# Altium schematic symbol library 13-Logic 数字 IC.SchLib: 324 symbols (part 2 of 30) (continued)
## 5AGXMB1G4F40C4N_basicORCAD (continued)
part I pins: AA5 VCCT_GXBR1 (power), AA7 VCCA_GXBR1 (power), AA9 VCCA_FPLL (power), AA10 VCC (power), AA12 VCC (power), AA14 VCC (power), AA16 VCC (power), AA18 VCC (power), AA20 VCC (power), AA21 VCCP (power), AA22 VCC (power), AA24 VCC (power), AA25 VCCP (power), AA26 VCC (power), AA27 VCCPD3 (power), AA28 VCCPD3 (power), AA29 VCCPD3 (power), AA34 VCCT_GXBL1 (power), AB5 VCCR_GXBR (power), AB6 VCCR_GXBR (power), AB11 VCC (power), AB12 VCCPD4BCD (power), AB13 VCCPD4BCD (power), AB14 VCC_AUX (power), AB15 VCCP (power), AB16 VCCPD4BCD (power), AB17 VCC (power), AB18 VCCPD4BCD (power), AB19 VCCPD4BCD (power), AB20 VCCD_FPLL (power), AB21 VCCA_FPLL (power), AB22 VCCPD3 (power), AB23 VCCPD3 (power), AB24 VCCPD3 (power), AB26 VCC_AUX (power), AB30 VCCPD3 (power), AB33 VCCA_GXBL1 (power), AB35 VCCT_GXBL1 (power), AC5 VCCL_GXBR0 (power), AC6 VCCL_GXBR0 (power), AC7 VCCH_GXBR0 (power), AC9 VCCA_FPLL (power), AC10 VCCPD4A (power), AC30 VCCA_FPLL (power), AC34 VCCR_GXBL (power), AC35 VCCR_GXBL (power), AD6 VCCT_GXBR0 (power), AD31 VCCD_FPLL (power), AD33 VCCH_GXBL0 (power), AD34 VCCL_GXBL0 (power), AD35 VCCL_GXBL0 (power), AE5 VCCT_GXBR0 (power), AE7 VCCA_GXBR0 (power), AE9 VCCD_FPLL (power), AE10 VCCPD4A (power), AE34 VCCT_GXBL0 (power), AF5 VCCR_GXBR (power), AF6 VCCR_GXBR (power), AF33 VCCA_GXBL0 (power), AF35 VCCT_GXBL0 (power), AG10 VCCIO4A (power), AG29 VCCPGM (power), AG34 VCCR_GXBL (power), AG35 VCCR_GXBL (power), AH29 VCCIO3A (power), AJ5 VCCIO4A (power), AJ15 VCCIO4C (power), AJ19 VCCIO4D (power), AJ22 VCCIO3D (power), AJ24 VCCIO3C (power), AJ30 VCCIO3A (power), AK13 VCCIO4B (power), AK18 VCCIO4D (power), AK28 VCCIO3B (power), AK35 VCCIO3A (power), AL5 VCCIO4A (power), AL21 VCCIO3D (power), AL25 VCCIO3C (power), AL27 VCCIO3B (power), AM12 VCCIO4B (power), AM15 VCCIO4C (power), AM19 VCCIO4D (power), AM22 VCCIO3D (power), AM24 VCCIO3C (power), AM30 VCCIO3A (power), AN5 VCCIO4A (power), AN10 VCCIO4B (power), AN13 VCCIO4B (power), AN18 VCCIO4D (power), AN28 VCCIO3B (power), AP21 VCCIO3D (power), AP25 VCCIO3C (power), AP35 VCCIO3A (power), AR5 VCCIO4A (power), AR12 VCCIO4B (power), AR15 VCCIO4C (power), AR19 VCCIO4D (power), AR22 VCCIO3D (power), AR24 VCCIO3C (power), AT10 VCCIO4B (power), AT18 VCCIO4D (power), AT28 VCCIO3B (power), AT35 VCCIO3A (power), AU5 VCCIO4A (power), AU21 VCCIO3D (power), AU25 VCCIO3C (power), AV15 VCCIO4C (power), B19 VCCIO7D (power), B35 VCCIO8A (power), C13 VCCIO7B (power), C21 VCCIO8D (power), C25 VCCIO8C (power), D10 VCCIO7B (power), D18 VCCIO7D (power), D22 VCCIO8D (power), D27 VCCIO8C (power), E5 VCCIO7A (power), E19 VCCIO7D (power), E28 VCCIO8B (power), E30 VCCIO8B (power), F13 VCCIO7B (power), F16 VCCIO7C (power), F21 VCCIO8D (power), F25 VCCIO8C (power), G5 VCCIO7A (power), G10 VCCIO7B (power), G15 VCCIO7C (power), G18 VCCIO7D (power), G22 VCCIO8D (power), G27 VCCIO8C (power), G31 VCCIO8A (power), G33 VCCIO8A (power), H7 VCCIO7A (power), H19 VCCIO7D (power), H30 VCCIO8B (power), J5 VCCIO7A (power), J25 VCCIO8C (power), K10 VCCIO7B (power), K15 VCCIO7C (power), K22 VCCIO8D (power), K28 VCCIO8B (power), K31 VCCIO8A (power), K33 VCCIO8A (power), L5 VCCIO7A (power), L13 VCCIO7B (power), L16 VCCIO7C (power), L21 VCCIO8D (power), M9 VCCIO7A (power), M18 VCCIO7D (power), M24 VCCIO8C (power), N11 VCCPGM (power), P5 VCCR_GXBR (power), P8 VCCPD7A (power), P33 VCCIO8A (power), R5 VCCL_GXBR2 (power), R6 VCCL_GXBR2 (power), R7 VCCH_GXBR2 (power), R9 VCCD_FPLL (power), R10 VCCPD7A (power), R32 VCCPD8 (power), R33 VCCBAT (power), R35 VCCR_GXBL (power), T6 VCCT_GXBR2 (power), T12 VCCPD7BCD (power), T13 VCCPD7BCD (power), T16 VCCPD7BCD (power), T30 VCCPD8 (power), T31 VCCD_FPLL (power), T33 VCCH_GXBL2 (power), T34 VCCL_GXBL2 (power), T35 VCCL_GXBL2 (power), U5 VCCT_GXBR2 (power), U7 VCCA_GXBR2 (power), U9 VCCA_FPLL (power), U10 VCC (power), U12 VCC (power), U14 VCC_AUX (power), U16 VCCP (power), U18 VCCPD7BCD (power), U19 VCCPD7BCD (power), U21 VCCPD8 (power), U22 VCCPD8 (power), U24 VCCPD8 (power), U26 VCCPD8 (power), U28 VCC_AUX (power), U29 VCCPD8 (power), U34 VCCT_GXBL2 (power), V5 VCCR_GXBR (power), V6 VCCR_GXBR (power), V11 VCC (power), V13 VCCP (power), V15 VCC (power), V17 VCC (power), V19 VCCD_FPLL (power), V20 VCCA_FPLL (power), V22 VCCP (power), V23 VCC (power), V25 VCCP (power), V27 VCCP (power), V29 VCC (power), V31 VCCA_FPLL (power), V33 VCCA_GXBL2 (power), V35 VCCT_GXBL2 (power), W5 VCCL_GXBR1 (power), W6 VCCL_GXBR1 (power), W7 VCCH_GXBR1 (power), W9 VCCD_FPLL (power), W10 VCC (power), W12 VCC (power), W14 VCC (power), W16 VCC (power), W18 VCC (power), W20 VCC (power), W22 VCC (power), W24 VCC (power), W26 VCC (power), W28 VCC (power), W30 VCCD_FPLL (power), W34 VCCR_GXBL (power), W35 VCCR_GXBL (power), Y6 VCCT_GXBR1 (power), Y11 VCC (power), Y13 VCCP (power), Y15 VCC (power), Y17 VCC (power), Y19 VCC (power), Y21 VCC (power), Y23 VCC (power), Y25 VCC (power), Y27 VCCP (power), Y29 VCC (power), Y30 VCCA_FPLL (power), Y33 VCCH_GXBL1 (power), Y34 VCCL_GXBL1 (power), Y35 VCCL_GXBL1 (power)
part J pins: A2 GND (power), A3 GND (power), A4 GND (power), A5 GND (power), AA3 GND (power), AA4 GND (power), AA6 GND (power), AA8 GND (power), AA11 GND (power), AA13 GND (power), AA15 GND (power), AA17 GND (power), AA19 GND (power), AA23 GND (power), AA30 GND (power), AA31 GND (power), AA32 GND (power), AA33 GND (power), AA35 GND (power), AA38 GND (power), AA39 GND (power), AB1 GND (power), AB2 GND (power), AB7 GND (power), AB10 GND (power), AB31 GND (power), AB32 GND (power), AB34 GND (power), AB36 GND (power), AB37 GND (power), AC3 GND (power), AC4 GND (power), AC8 GND (power), AC11 GND (power), AC14 GND (power), AC17 GND (power), AC20 GND (power), AC23 GND (power), AC26 GND (power), AC28 GND (power), AC33 GND (power), AC38 GND (power), AC39 GND (power), AD1 GND (power), AD2 GND (power), AD5 GND (power), AD7 GND (power), AD8 GND (power), AD9 GND (power), AD10 GND (power), AD30 GND (power), AD32 GND (power), AD36 GND (power), AD37 GND (power), AE3 GND (power), AE4 GND (power), AE6 GND (power), AE8 GND (power), AE30 GND (power), AE33 GND (power), AE35 GND (power), AE38 GND (power), AE39 GND (power), AF1 GND (power), AF2 GND (power), AF9 GND (power), AF11 GND (power), AF14 GND (power), AF17 GND (power), AF20 GND (power), AF23 GND (power), AF26 GND (power), AF29 GND (power), AF30 GND (power), AF31 GND (power), AF32 GND (power), AF34 GND (power), AF36 GND (power), AF37 GND (power), AG1 GND (power), AG2 GND (power), AG3 GND (power), AG4 GND (power), AG5 GND (power), AG6 GND (power), AG7 GND (power), AG8 GND (power), AG9 GND (power), AG31 GND (power), AG38 GND (power), AG39 GND (power), AH1 GND (power), AH2 GND (power), AH5 GND (power), AH32 GND (power), AH33 GND (power), AH34 GND (power), AH35 GND (power), AH36 GND (power), AH37 GND (power), AJ1 GND (power), AJ2 GND (power), AJ3 GND (power), AJ4 GND (power), AJ8 GND (power), AJ11 GND (power), AJ14 GND (power), AJ17 GND (power), AJ20 GND (power), AJ23 GND (power), AJ26 GND (power), AJ29 GND (power), AJ32 GND (power), AJ35 GND (power), AJ38 GND (power), AJ39 GND (power), AK1 GND (power), AK2 GND (power), AK5 GND (power), AK36 GND (power), AK37 GND (power), AL1 GND (power), AL2 GND (power), AL3 GND (power), AL4 GND (power), AL35 GND (power), AL38 GND (power), AL39 GND (power), AM1 GND (power), AM2 GND (power), AM5 GND (power), AM8 GND (power), AM11 GND (power), AM14 GND (power), AM17 GND (power), AM20 GND (power), AM23 GND (power), AM26 GND (power), AM29 GND (power), AM32 GND (power), AM36 GND (power), AM37 GND (power), AN3 GND (power), AN4 GND (power), AN35 GND (power), AN38 GND (power), AN39 GND (power), AP1 GND (power), AP2 GND (power), AP5 GND (power), AP36 GND (power), AP37 GND (power), AR3 GND (power), AR4 GND (power), AR8 GND (power), AR11 GND (power), AR14 GND (power), AR17 GND (power), AR20 GND (power), AR23 GND (power), AR26 GND (power), AR29 GND (power), AR32 GND (power), AR35 GND (power), AR38 GND (power), AR39 GND (power), AT1 GND (power), AT2 GND (power), AT5 GND (power), AT36 GND (power), AT37 GND (power), AU3 GND (power), AU4 GND (power), AU35 GND (power), AU38 GND (power), AU39 GND (power), AV1 GND (power), AV2 GND (power), AV5 GND (power), AV8 GND (power), AV11 GND (power), AV14 GND (power), AV17 GND (power), AV20 GND (power), AV23 GND (power), AV26 GND (power), AV29 GND (power), AV32 GND (power), AV35 GND (power), AV36 GND (power), AV37 GND (power), AV38 GND (power), AV39 GND (power), AW35 GND (power), AW38 GND (power), B1 GND (power), B2 GND (power), B5 GND (power), B8 GND (power), B11 GND (power), B14 GND (power), B17 GND (power), B20 GND (power), B23 GND (power), B26 GND (power), B29 GND (power), B32 GND (power), B36 GND (power), B37 GND (power), C1 GND (power), C2 GND (power), C3 GND (power), C4 GND (power), C35 GND (power), C38 GND (power), C39 GND (power)
part K pins: D1 GND (power), D2 GND (power), D5 GND (power), D36 GND (power), D37 GND (power), D38 GND (power), D39 GND (power), E1 GND (power), E2 GND (power), E3 GND (power), E4 GND (power), E8 GND (power), E11 GND (power), E14 GND (power), E17 GND (power), E20 GND (power), E23 GND (power), E26 GND (power), E29 GND (power), E32 GND (power), E35 GND (power), E38 GND (power), E39 GND (power), F1 GND (power), F2 GND (power), F5 GND (power), F36 GND (power), F37 GND (power), F38 GND (power), F39 GND (power), G1 GND (power), G2 GND (power), G3 GND (power), G4 GND (power), G35 GND (power), G38 GND (power), G39 GND (power), H1 GND (power), H2 GND (power), H5 GND (power), H8 GND (power), H11 GND (power), H14 GND (power), H17 GND (power), H20 GND (power), H23 GND (power), H26 GND (power), H29 GND (power), H32 GND (power), H36 GND (power), H37 GND (power), H38 GND (power), H39 GND (power), J1 GND (power), J2 GND (power), J3 GND (power), J4 GND (power), J35 GND (power), J38 GND (power), J39 GND (power), K1 GND (power), K2 GND (power), K5 GND (power), K36 GND (power), K37 GND (power), K38 GND (power), K39 GND (power), L1 GND (power), L2 GND (power), L3 GND (power), L4 GND (power), L8 GND (power), L11 GND (power), L14 GND (power), L17 GND (power), L20 GND (power), L23 GND (power), L26 GND (power), L29 GND (power), L32 GND (power), L35 GND (power), L38 GND (power), L39 GND (power), M1 GND (power), M2 GND (power), M5 GND (power), M36 GND (power), M37 GND (power), M38 GND (power), M39 GND (power), N1 GND (power), N2 GND (power), N3 GND (power), N4 GND (power), N5 GND (power), N6 GND (power), N8 GND (power), N35 GND (power), N38 GND (power), N39 GND (power), P1 GND (power), P2 GND (power), P6 GND (power), P7 GND (power), P11 GND (power), P14 GND (power), P17 GND (power), P20 GND (power), P23 GND (power), P26 GND (power), P29 GND (power), P32 GND (power), P35 GND (power), P36 GND (power), P37 GND (power), P38 GND (power), P39 GND (power), R3 GND (power), R4 GND (power), R8 GND (power), R34 GND (power), R38 GND (power), R39 GND (power), T1 GND (power), T2 GND (power), T5 GND (power), T7 GND (power), T8 GND (power), T9 GND (power), T10 GND (power), T32 GND (power), T36 GND (power), T37 GND (power), T38 GND (power), T39 GND (power), U3 GND (power), U4 GND (power), U6 GND (power), U8 GND (power), U11 GND (power), U13 GND (power), U15 GND (power), U17 GND (power), U20 GND (power), U23 GND (power), U25 GND (power), U27 GND (power), U30 GND (power), U31 GND (power), U32 GND (power), U33 GND (power), U35 GND (power), U38 GND (power), U39 GND (power), V1 GND (power), V2 GND (power), V7 GND (power), V8 GND (power), V9 GND (power), V10 GND (power), V12 GND (power), V14 GND (power), V16 GND (power), V18 GND (power), V21 GND (power), V24 GND (power), V26 GND (power), V28 GND (power), V30 GND (power), V32 GND (power), V34 GND (power), V36 GND (power), V37 GND (power), V38 GND (power), V39 GND (power), W3 GND (power), W4 GND (power), W8 GND (power), W11 GND (power), W13 GND (power), W15 GND (power), W17 GND (power), W19 GND (power), W21 GND (power), W23 GND (power), W25 GND (power), W27 GND (power), W29 GND (power), W31 GND (power), W32 GND (power), W33 GND (power), W38 GND (power), W39 GND (power), Y1 GND (power), Y2 GND (power), Y5 GND (power), Y7 GND (power), Y10 GND (power), Y12 GND (power), Y14 GND (power), Y16 GND (power), Y18 GND (power), Y20 GND (power), Y22 GND (power), Y24 GND (power), Y26 GND (power), Y28 GND (power), Y31 GND (power), Y32 GND (power), Y36 GND (power), Y37 GND (power), Y38 GND (power), Y39 GND (power)
part L pins: A38 DNU (io), AE20 DNU (io), AF3 DNU (io), AF4 DNU (io), AH3 DNU (io), AH4 DNU (io), AH31 DNU (io), AK3 DNU (io), AK4 DNU (io), AV3 DNU (io), AW3 DNU (io), B3 DNU (io), B4 DNU (io), B38 DNU (io), C5 DNU (io), C36 DNU (io), C37 DNU (io), D3 DNU (io), D4 DNU (io), E36 DNU (io), E37 DNU (io), F3 DNU (io), F4 DNU (io), G36 DNU (io), G37 DNU (io), H3 DNU (io), H4 DNU (io), J36 DNU (io), J37 DNU (io), K3 DNU (io), K4 DNU (io), L36 DNU (io), L37 DNU (io), M3 DNU (io), M4 DNU (io), N36 DNU (io), N37 DNU (io), P21 DNU (io), R36 DNU (io), R37 DNU (io), U36 DNU (io), U37 DNU (io), W36 DNU (io), W37 DNU (io)

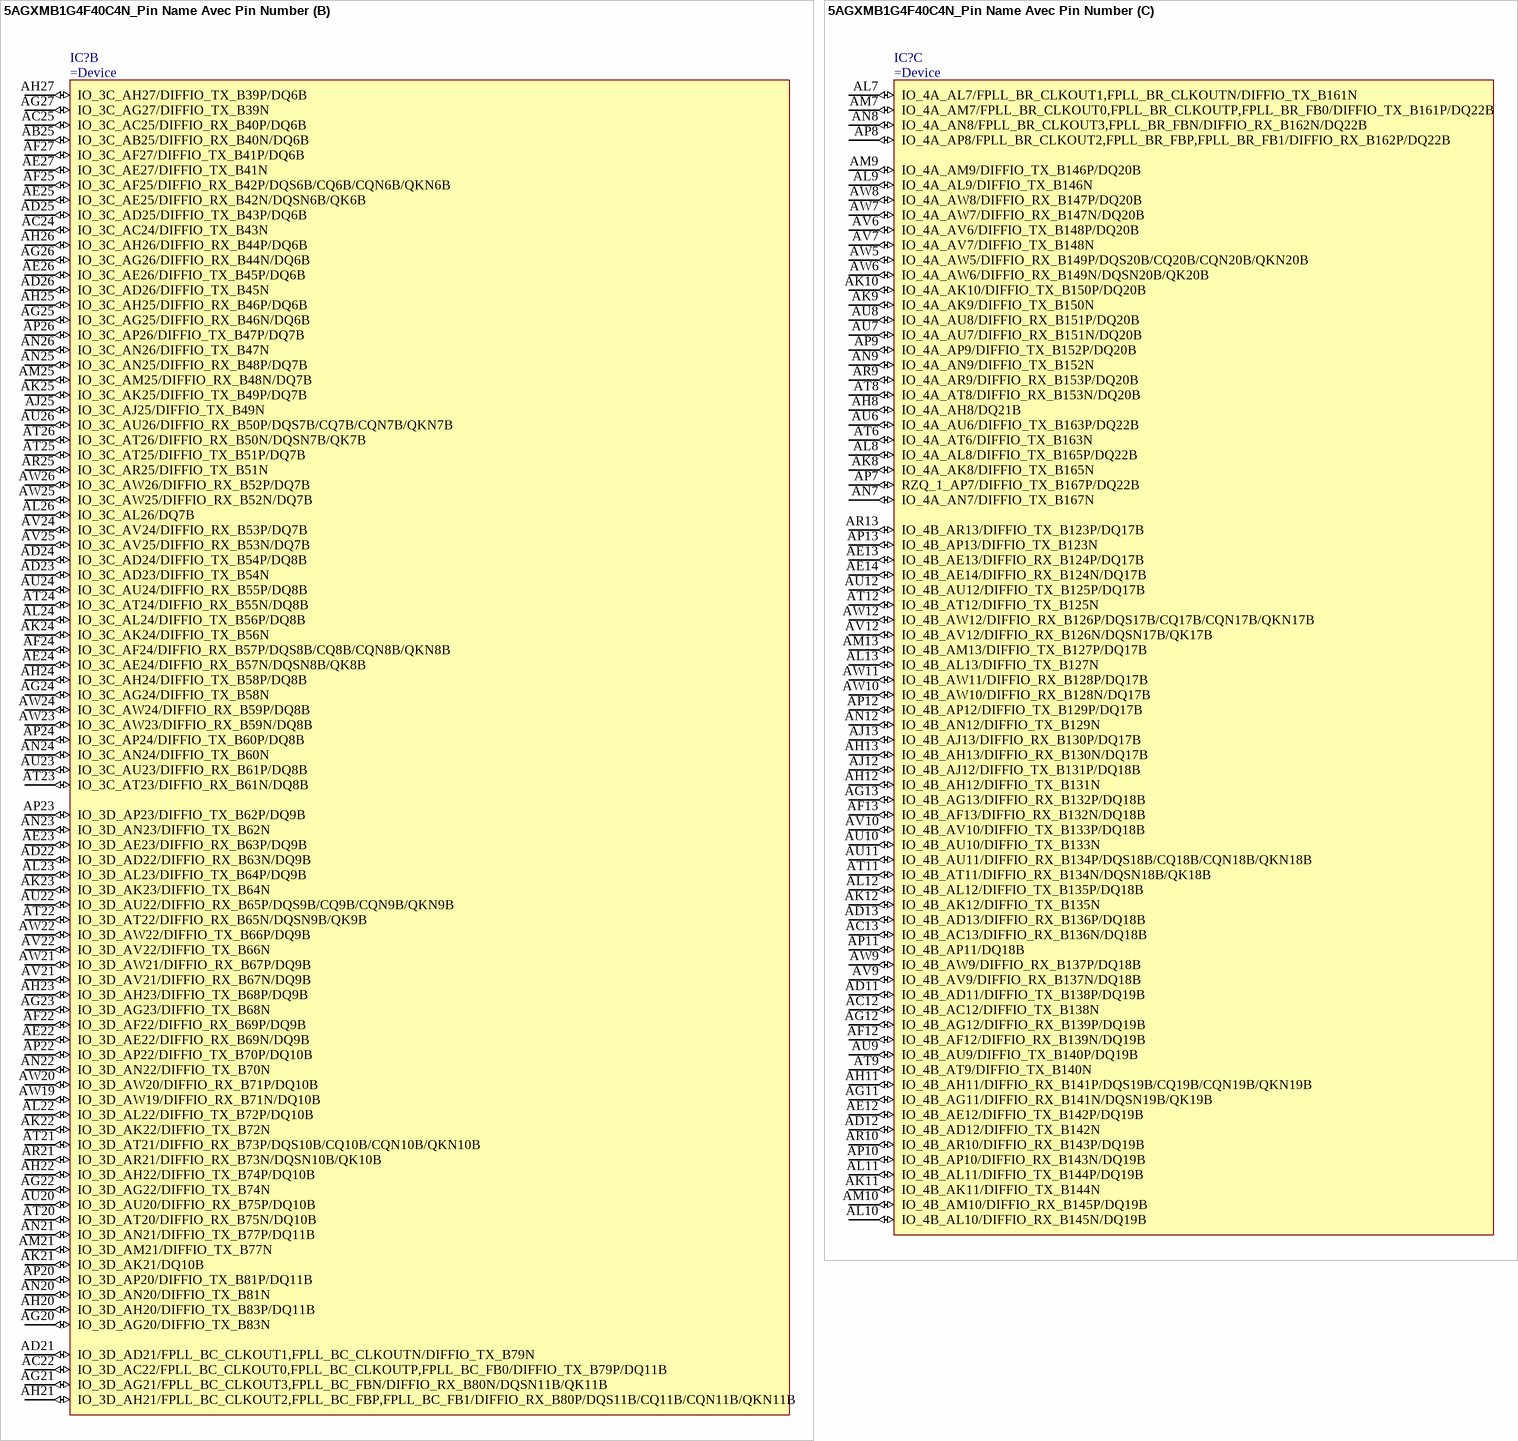
[diagram p13: symbol 5AGXMB1G4F40C4N_Pin Name Avec Pin Number]

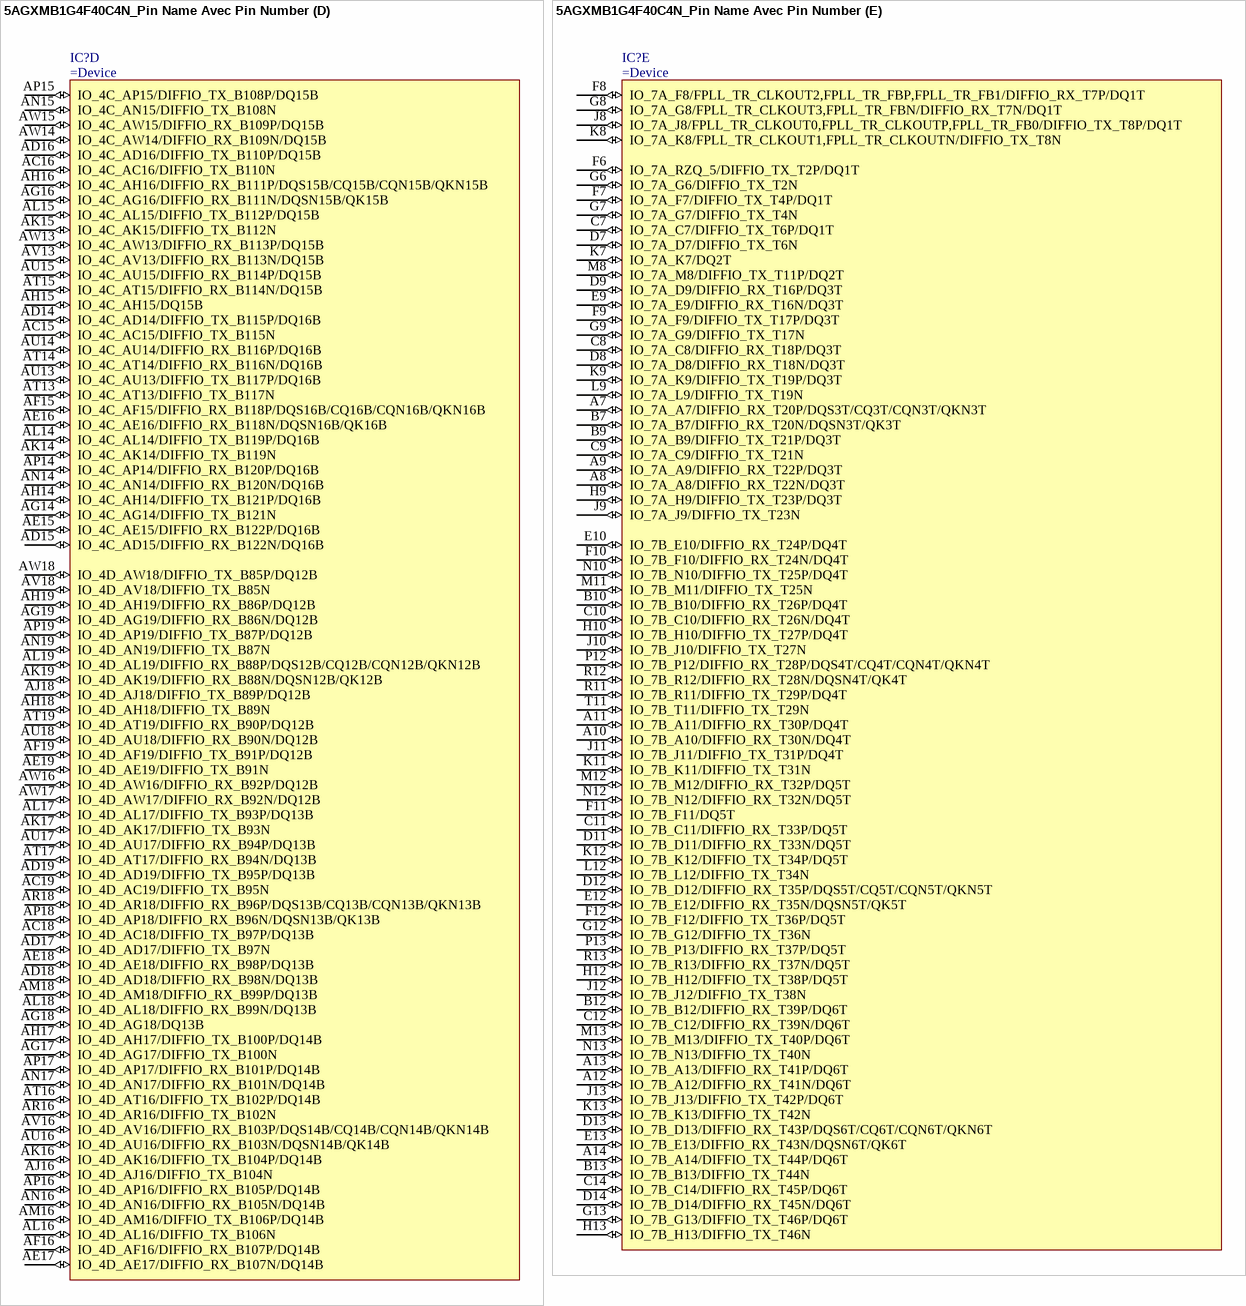
[diagram p14: symbol 5AGXMB1G4F40C4N_Pin Name Avec Pin Number]

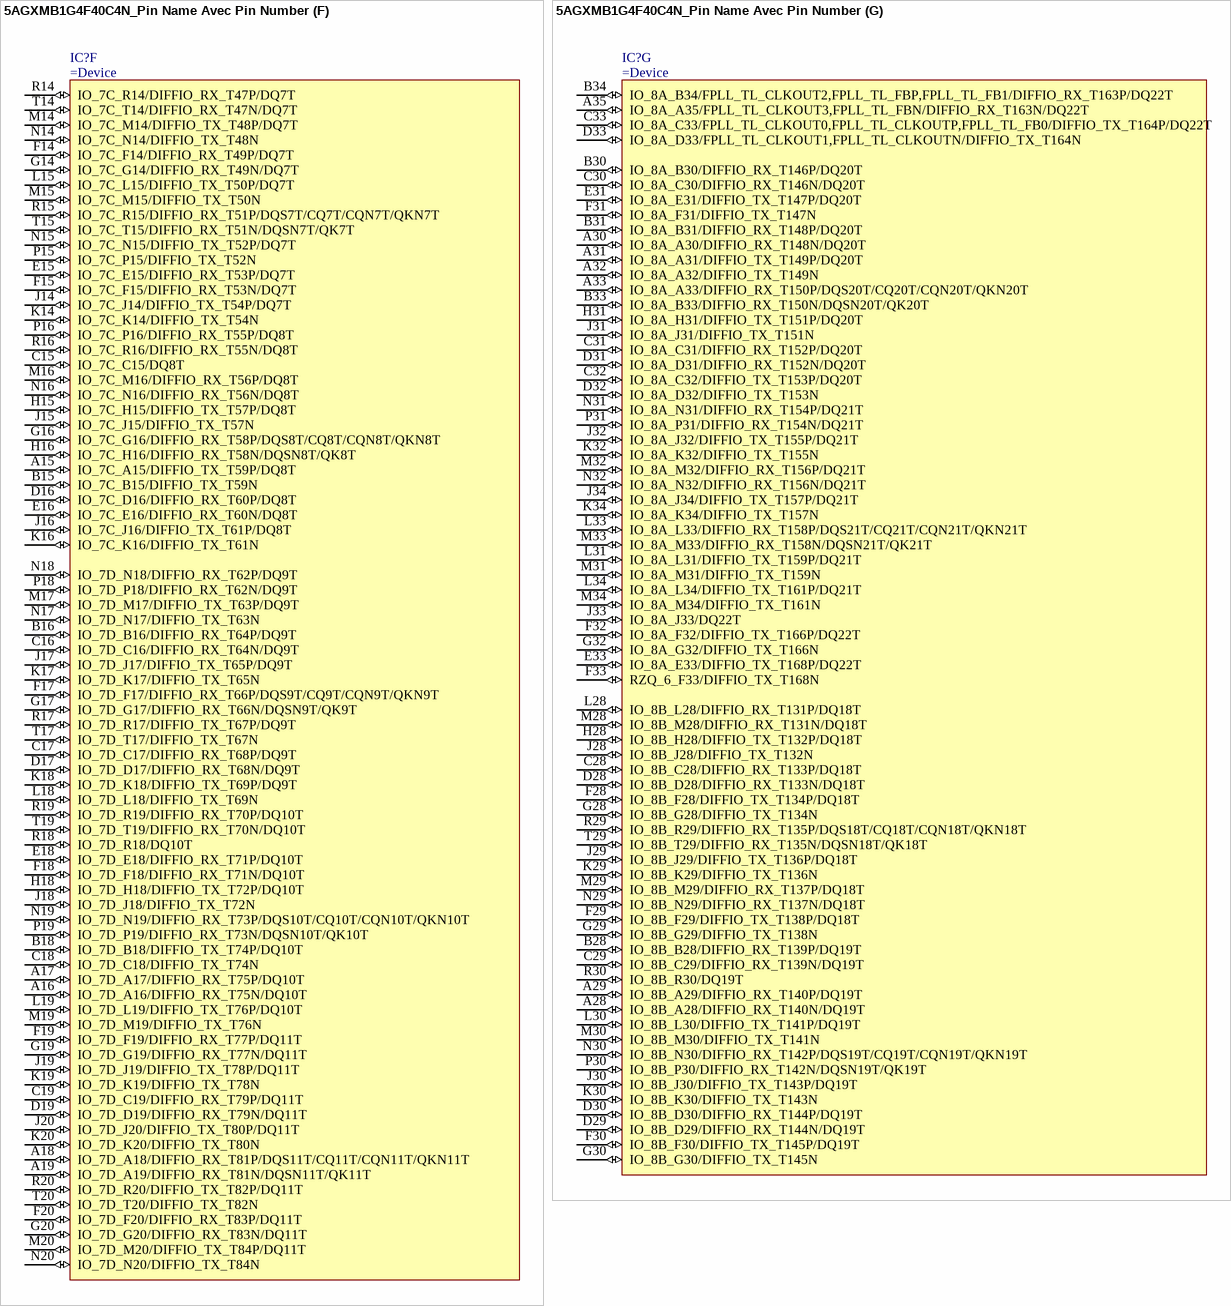
[diagram p15: symbol 5AGXMB1G4F40C4N_Pin Name Avec Pin Number]

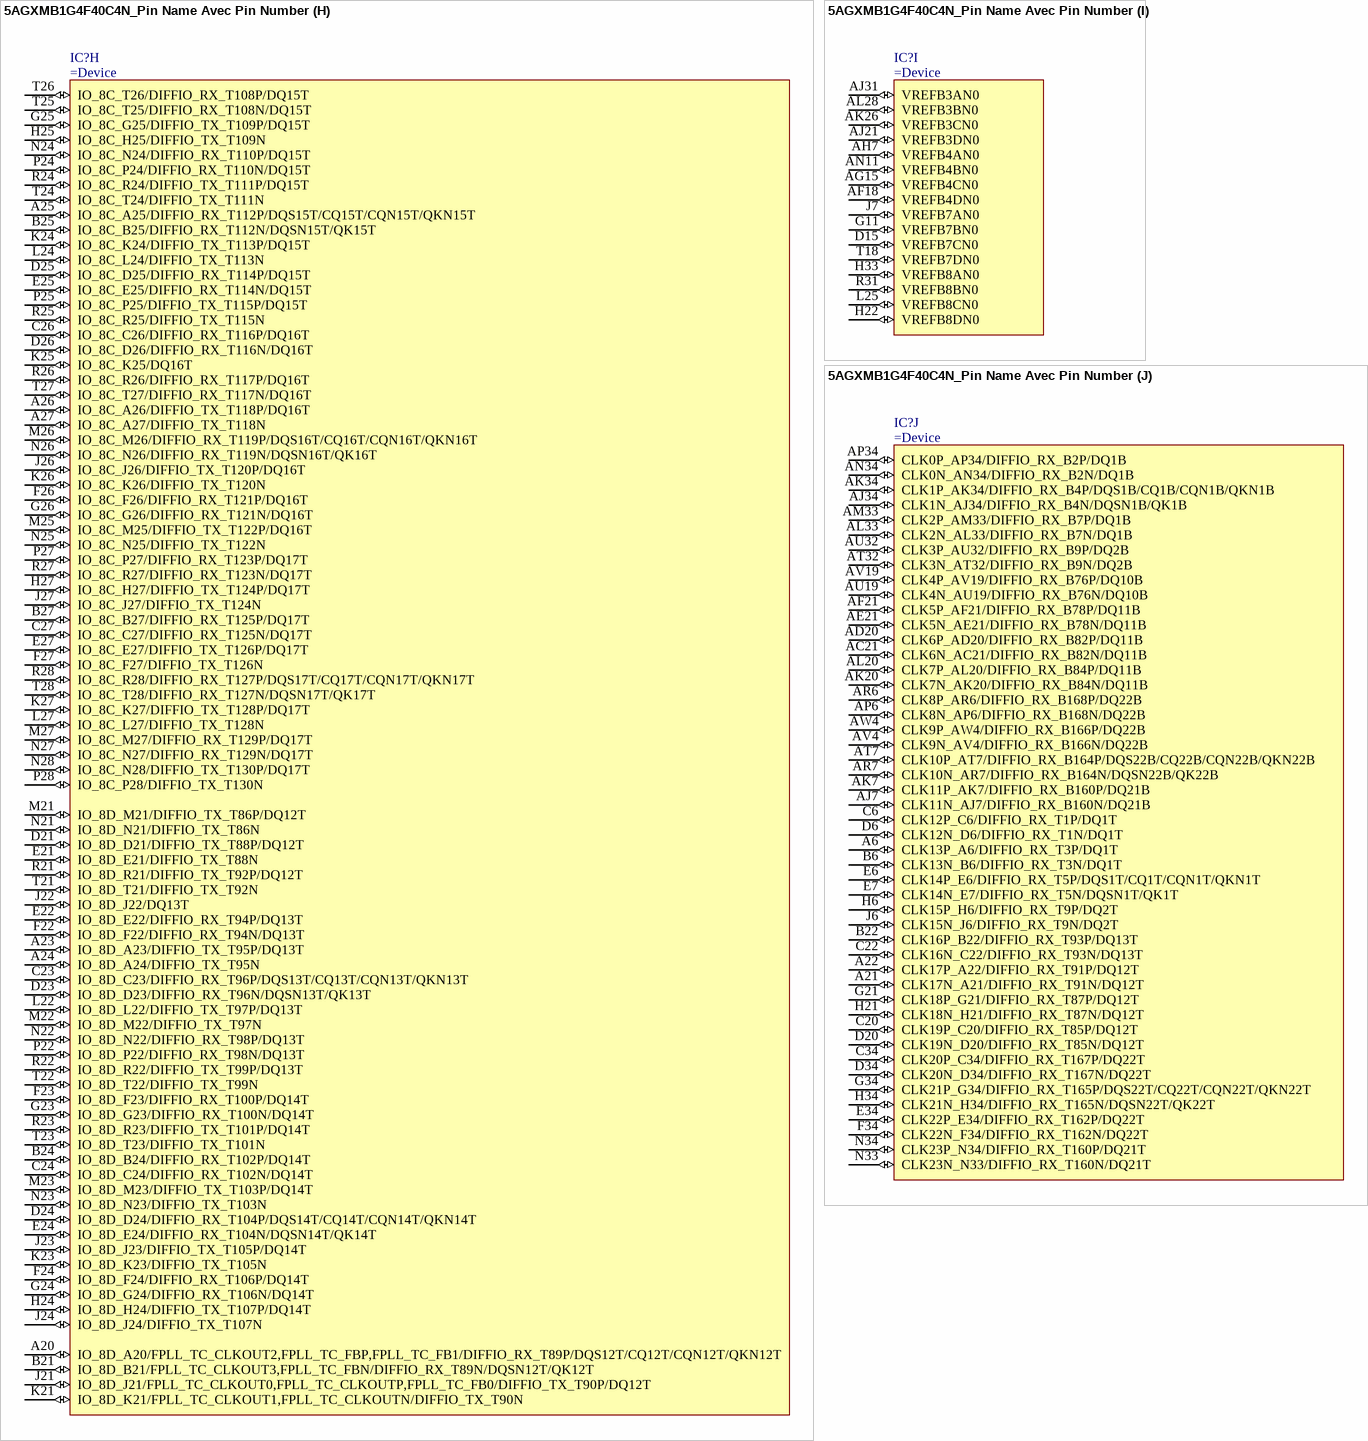
[diagram p16: symbol 5AGXMB1G4F40C4N_Pin Name Avec Pin Number]

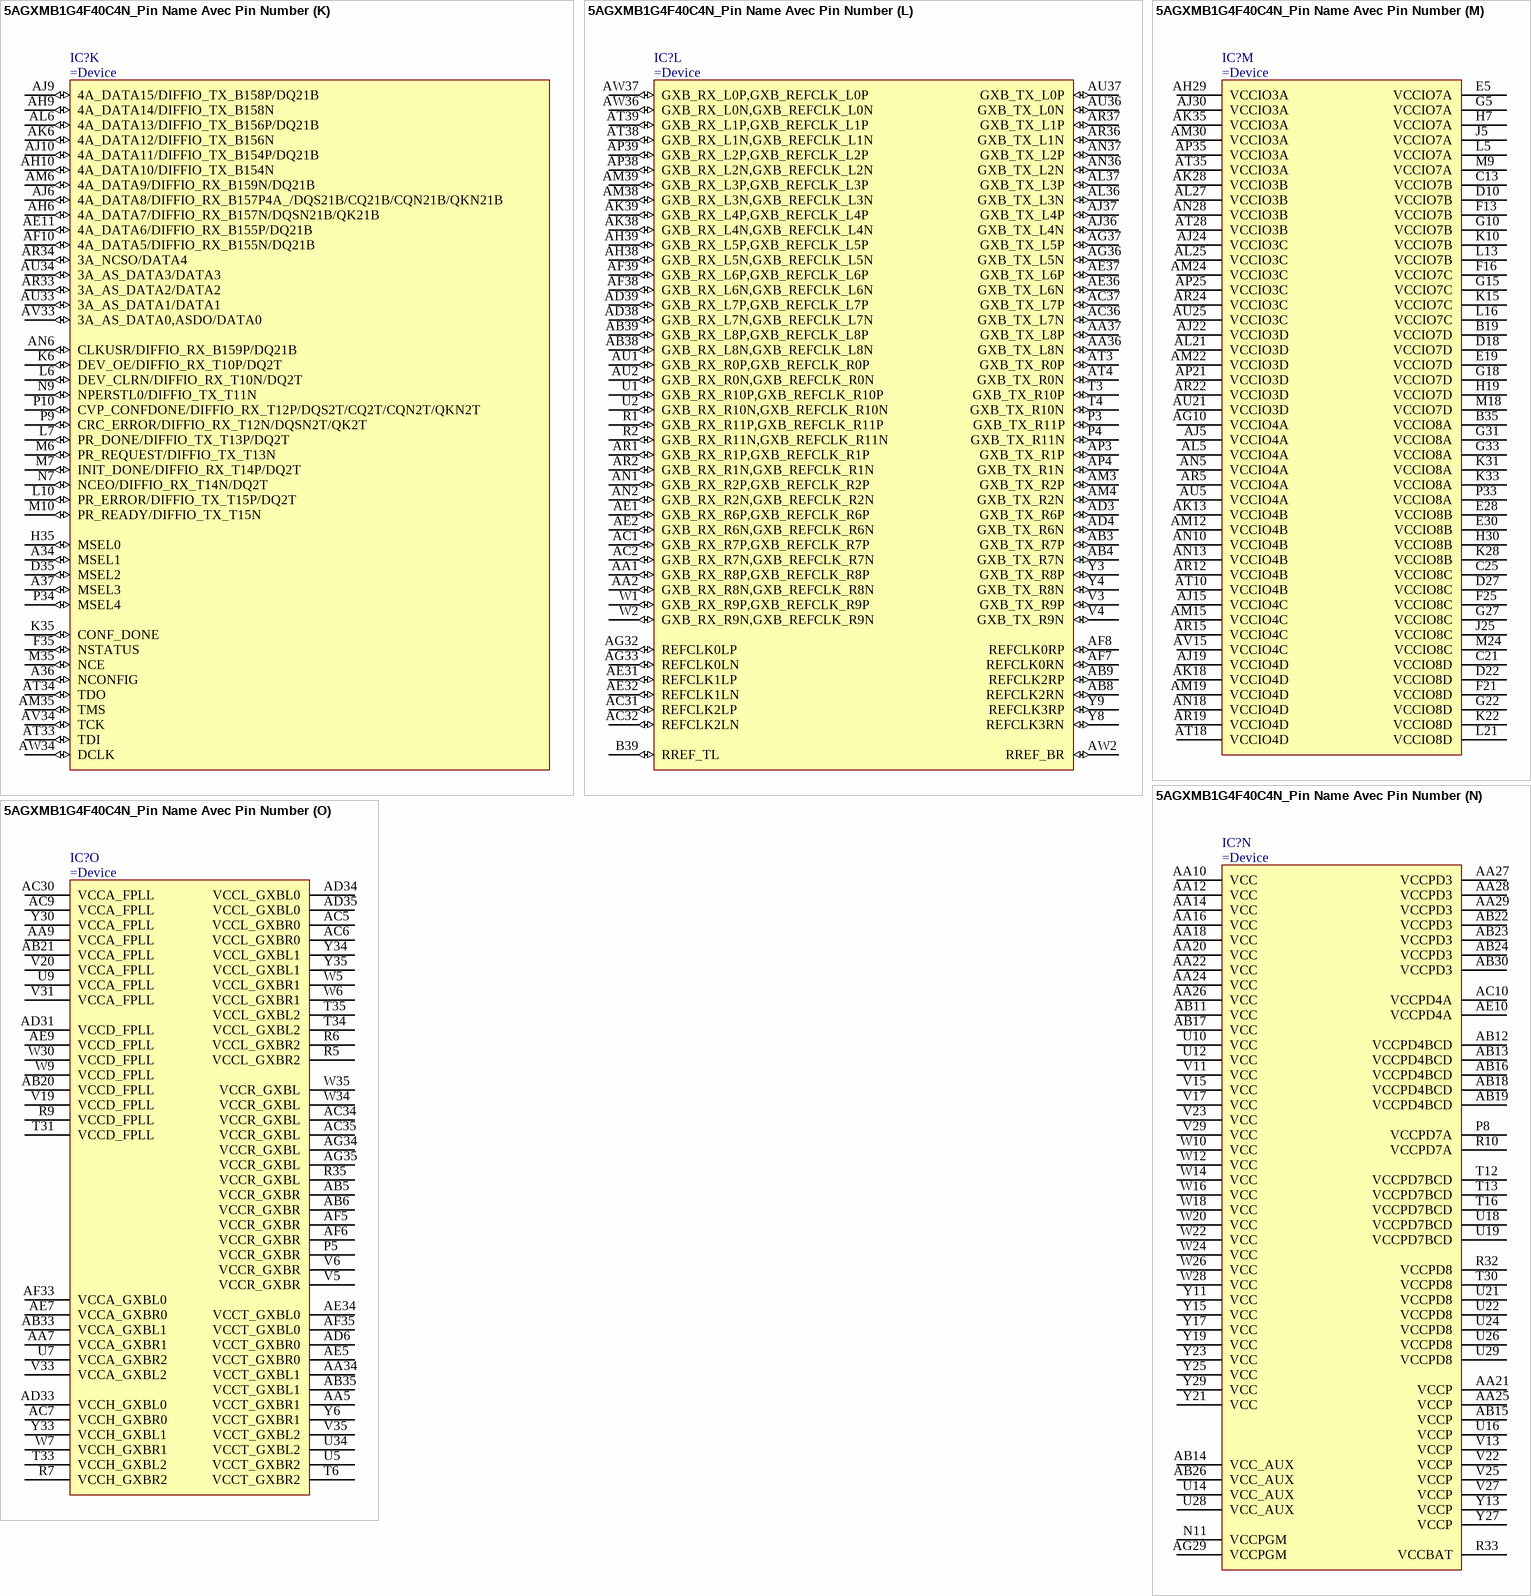
[diagram p17: symbol 5AGXMB1G4F40C4N_Pin Name Avec Pin Number]

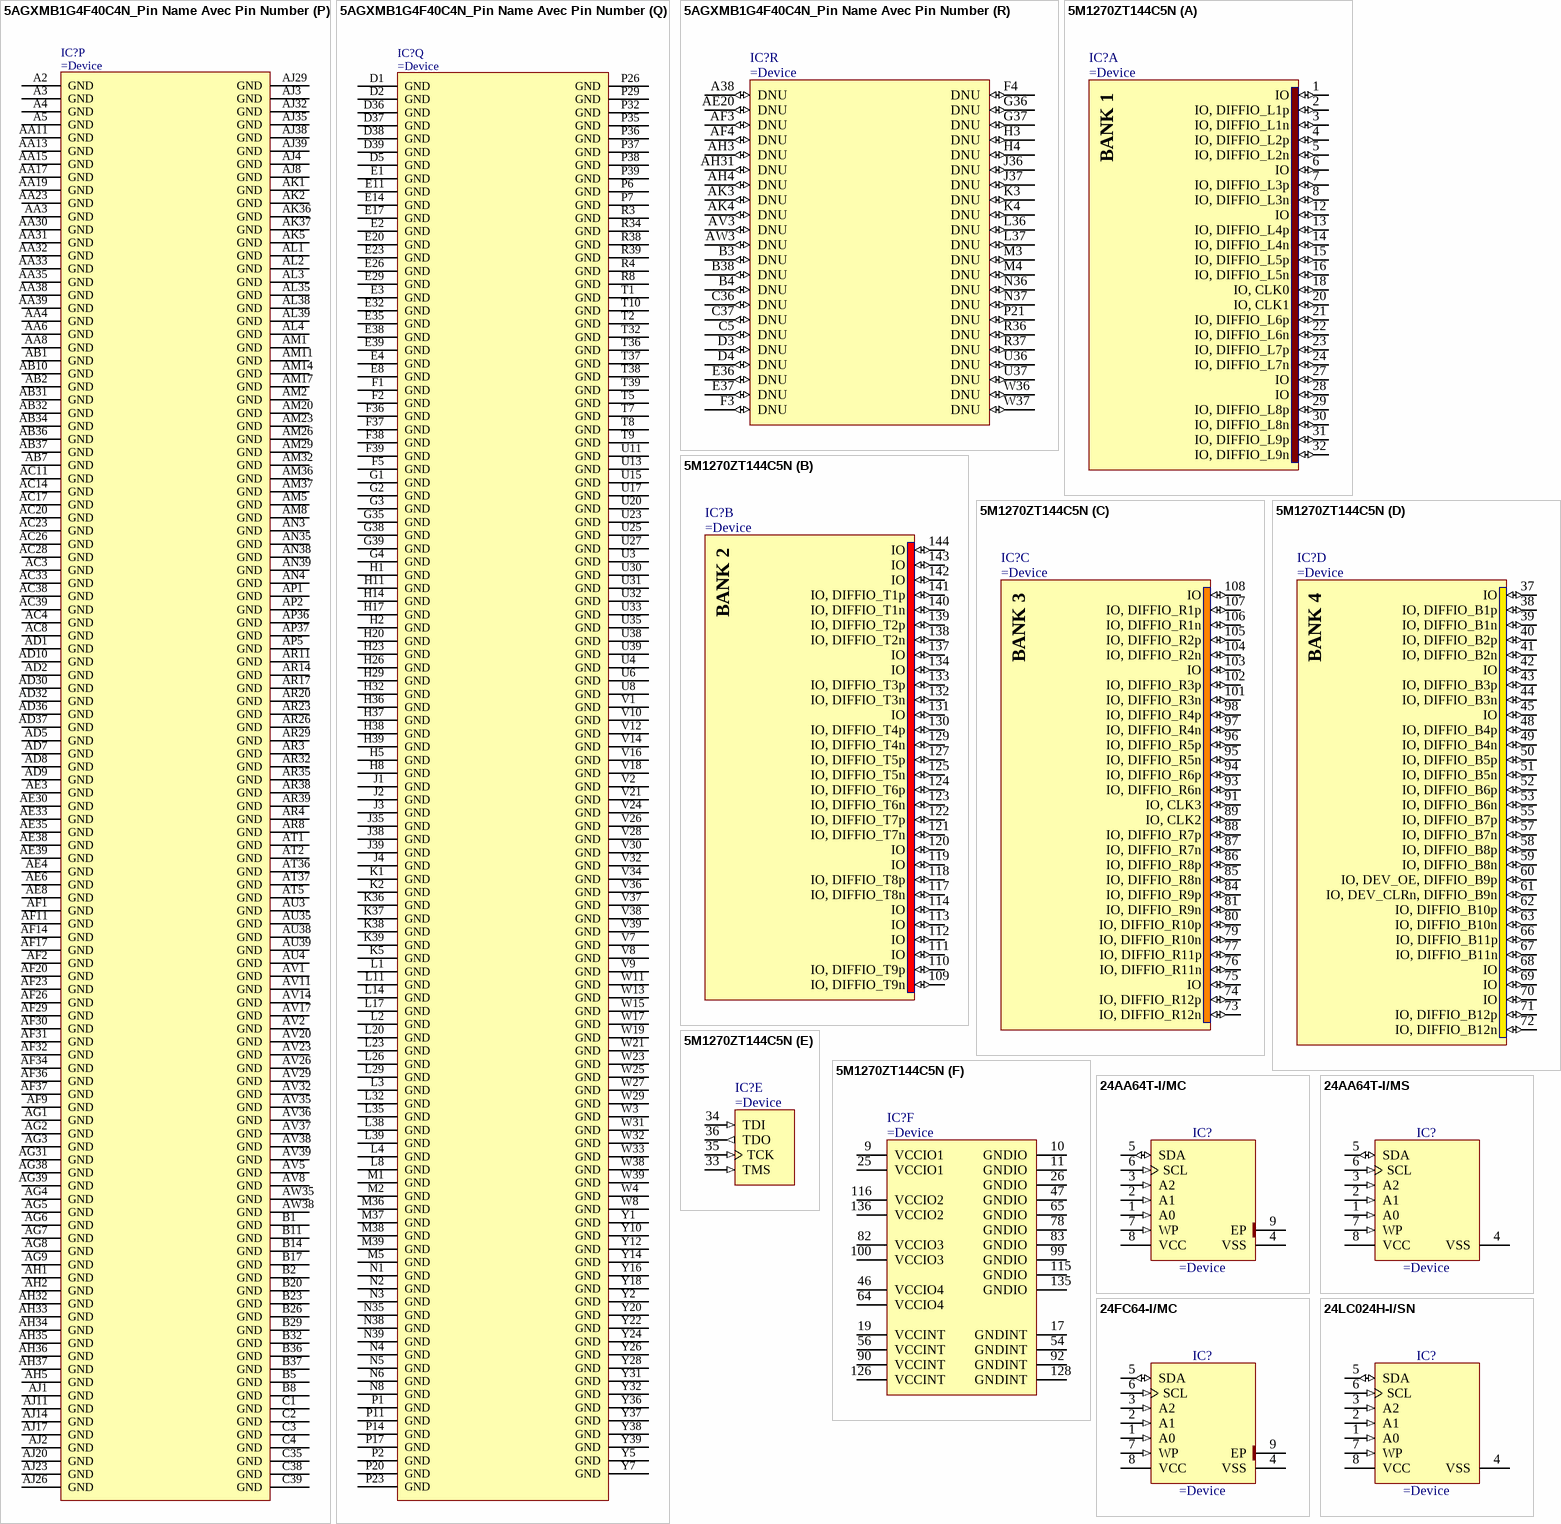
[diagram p18: symbols 5AGXMB1G4F40C4N_Pin Name Avec Pin Number to 24LC024H-I/SN]